# Altium footprint library CONN_HDR_2.54MM_RA.PcbLib: 62 footprints (part 1 of 5)
Each footprint in its own frame and in the unit in brackets; x right, y up, seen from the top. Pads: shape width x height; smd on the part's side, far side on the other; paste and mask are expansions set on the pad; w line width, h text height; cw(c..) or ccw(c..) is an arc to the next point about the centre after c.
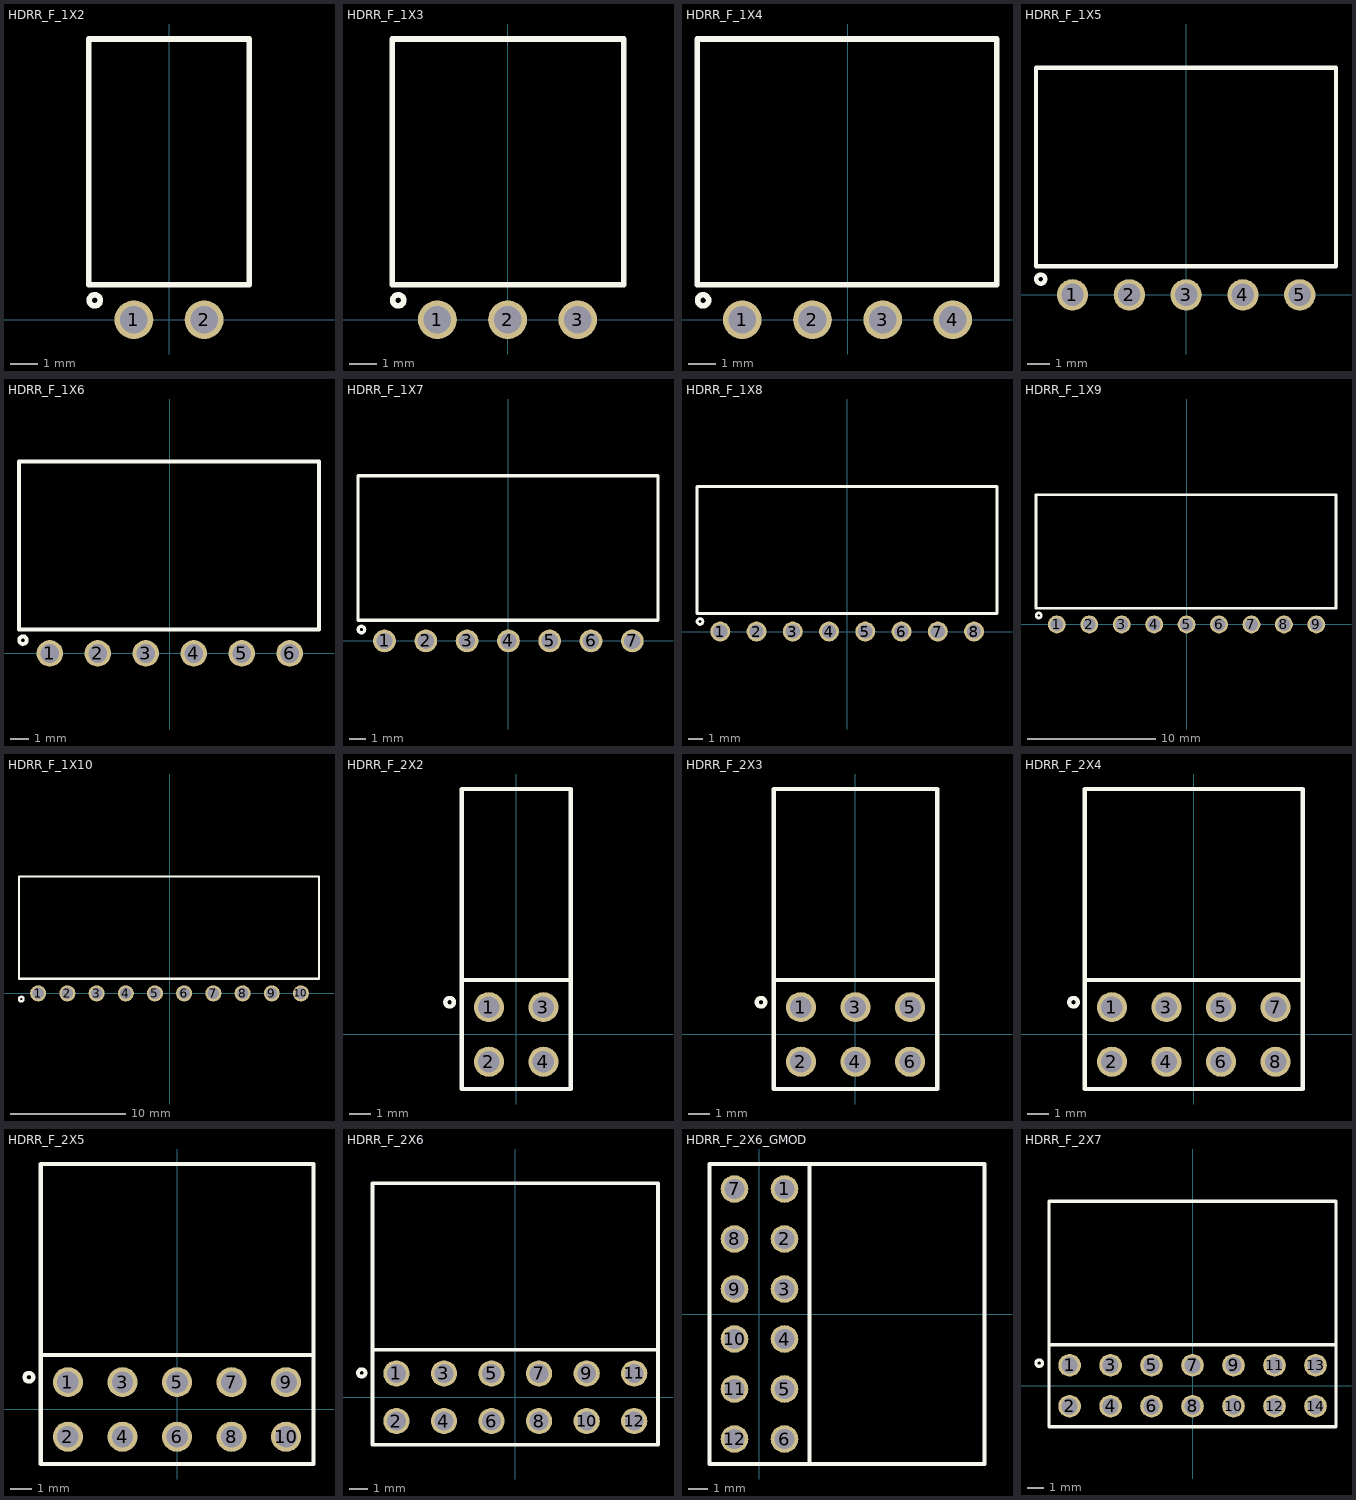
[diagram p0: the footprints below, top view; thin cyan lines are the x and y axes]

## HDRR_F_1X2 [mm] "Connector; Header; 2 Position; Right Angle"
height 12
pads (2):
  round 1.4 / inner round 1.4 / far side oval 1.4x2.2 hole 1: 1(-1.27,0) 2(1.27,0)
Top Overlay:
  circle w0.2: c-2.69,0.7 r0.2
  lines w0.2: -2.9,1.27 2.9,1.27 2.9,10.16 -2.9,10.16 -2.9,1.27
3D body "HDR_F_1X2RA.step": height 2.55, standoff -3.1, extent -2.786,-0.3 2.786,10

## HDRR_F_1X3 [mm] "Connector; Header; 3 Position; Right Angle"
height 12
pads (3):
  round 1.4 / inner round 1.4 / far side oval 1.4x2.2 hole 1: 1(-2.54,0) 2(0,0) 3(2.54,0)
Top Overlay:
  circle w0.2: c-3.96,0.7 r0.2
  lines w0.2: -4.17,1.27 4.2,1.27 4.2,10.16 -4.17,10.16 -4.17,1.27
3D body "HDR_F_1X3RA.step": height 2.55, standoff -3.1, extent -4.056,-0.3 4.039,10

## HDRR_F_1X4 [mm] "Connector; Header; 4 Position; Right Angle"
height 12
pads (4):
  round 1.4 / inner round 1.4 / far side oval 1.4x2.2 hole 1: 1(-3.81,0) 2(-1.27,0) 3(1.27,0) 4(3.81,0)
Top Overlay:
  circle w0.2: c-5.23,0.7 r0.2
  lines w0.2: -5.44,1.27 5.4,1.27 5.4,10.16 -5.44,10.16 -5.44,1.27
3D body "HDR_F_1X2RA.step": height 2.55, standoff -3.1, extent -0.246,-0.3 5.326,10
3D body "HDR_F_1X2RA.step": height 2.55, standoff -3.1, extent -5.326,-0.3 0.246,10

## HDRR_F_1X5 [mm] "Connector; Header; 5 Position"
pads (5):
  round 1.4 / inner round 1.4 / far side oval 1.4x2.2 hole 1 mask+0.1: 1(-5.08,0) 2(-2.54,0) 3(0,0) 4(2.54,0) 5(5.08,0)
Top Overlay:
  circle w0.2: c-6.5,0.7 r0.2
  lines w0.2: -6.71,1.27 6.7,1.27 6.7,10.16 -6.71,10.16 -6.71,1.27
3D body "HDR_F_1X2RA.step": height 2.55, standoff -3.1, extent -6.596,-0.3 -1.024,10
3D body "HDR_F_1X3RA.step": height 2.55, standoff -3.1, extent -1.516,-0.3 6.579,10

## HDRR_F_1X6 [mm] "Connector; Header; 6 Position"
pads (6):
  round 1.4 / inner round 1.4 / far side oval 1.4x2.2 hole 1 mask+0.1: 1(-6.35,0) 2(-3.81,0) 3(-1.27,0) 4(1.27,0) 5(3.81,0) 6(6.35,0)
Top Overlay:
  circle w0.2: c-7.77,0.7 r0.2
  lines w0.2: -7.98,1.27 7.9,1.27 7.9,10.16 -7.98,10.16 -7.98,1.27
3D body "HDR_F_1X3RA.step": height 2.55, standoff -3.1, extent -0.246,-0.3 7.849,10
3D body "HDR_F_1X3RA.step": height 2.55, standoff -3.1, extent -7.866,-0.3 0.229,10

## HDRR_F_1X7 [mm] "Connector; Header; 7 Position"
pads (7):
  round 1.4 / inner round 1.4 / far side oval 1.4x2.2 hole 1 mask+0.1: 1(-7.62,0) 2(-5.08,0) 3(-2.54,0) 4(0,0) 5(2.54,0) 6(5.08,0) 7(7.62,0)
Top Overlay:
  circle w0.2: c-9.04,0.7 r0.2
  lines w0.2: -9.25,1.27 -9.25,10.16 9.2,10.16 9.2,1.27 -9.25,1.27
3D body "HDR_F_1X3RA.step": height 2.55, standoff -3.1, extent 1.024,-0.3 9.119,10
3D body "HDR_F_1X2RA.step": height 2.55, standoff -3.1, extent -9.136,-0.3 -3.564,10
3D body "HDR_F_1X2RA.step": height 2.55, standoff -3.1, extent -4.056,-0.3 1.516,10

## HDRR_F_1X8 [mm] "Connector; Header; 8 Position"
pads (8):
  round 1.4 / inner round 1.4 / far side oval 1.4x2.2 hole 1 mask+0.1: 1(-8.89,0) 2(-6.35,0) 3(-3.81,0) 4(-1.27,0) 5(1.27,0) 6(3.81,0) 7(6.35,0) 8(8.89,0)
Top Overlay:
  circle w0.2: c-10.31,0.7 r0.2
  lines w0.2: -10.52,1.27 -10.52,10.16 10.5,10.16 10.5,1.27 -10.52,1.27
3D body "HDR_F_1X3RA.step": height 2.55, standoff -3.1, extent 2.294,-0.3 10.389,10
3D body "HDR_F_1X3RA.step": height 2.55, standoff -3.1, extent -5.326,-0.3 2.769,10
3D body "HDR_F_1X2RA.step": height 2.55, standoff -3.1, extent -10.406,-0.3 -4.834,10

## HDRR_F_1X9 [mm] "Connector; Header; 9 Position"
pads (9):
  round 1.4 / inner round 1.4 / far side oval 1.4x2.2 hole 1 mask+0.1: 1(-10.16,0) 2(-7.62,0) 3(-5.08,0) 4(-2.54,0) 5(0,0) 6(2.54,0) 7(5.08,0) 8(7.62,0) 9(10.16,0)
Top Overlay:
  circle w0.2: c-11.58,0.7 r0.2
  lines w0.2: -11.79,1.27 11.7,1.27 11.7,10.16 -11.79,10.16 -11.79,1.27
3D body "HDR_F_1X3RA.step": height 2.55, standoff -3.1, extent 3.564,-0.3 11.659,10
3D body "HDR_F_1X3RA.step": height 2.55, standoff -3.1, extent -4.056,-0.3 4.039,10
3D body "HDR_F_1X3RA.step": height 2.55, standoff -3.1, extent -11.676,-0.3 -3.581,10

## HDRR_F_1X10 [mm] "Connector; Header; 10 Position"
pads (10):
  round 1.4 / inner round 1.4 / far side oval 1.4x2.2 hole 1 mask+0.1: 1(-11.43,0) 2(-8.89,0) 3(-6.35,0) 4(-3.81,0) 5(-1.27,0) 6(1.27,0) 7(3.81,0) 8(6.35,0) 9(8.89,0) 10(11.43,0)
Top Overlay:
  circle w0.2: c-12.9,-0.5 r0.2
  lines w0.2: -13.1,1.27 13,1.27 13,10.16 -13.1,10.16 -13.1,1.27
3D body "BB02-JB102-XR2-000000-6T_rev1.9.STEP": height 2.55, standoff -3.1, extent -12.954,-0.3 12.946,10

## HDRR_F_2X2 [mm] "Connector; Header; 2x2 Position"
height 5
pads (4):
  round 1.4 / inner round 1.4 / far side oval 1.4x2.2 hole 1: 1(-1.27,1.27) 2(-1.27,-1.27) 3(1.27,1.27) 4(1.27,-1.27)
Top Overlay:
  circle w0.2: c-3.1,1.5 r0.2
  lines w0.2: -2.54,2.54 -2.54,11.43 2.54,11.43 2.54,2.54 ; -2.54,2.54 2.54,2.54 ; -2.54,2.54 -2.54,-2.54 2.54,-2.54 2.54,2.54
3D body "PBD-4R.step": height 5, standoff -3, extent -2.54,-1.57 2.54,11.43

## HDRR_F_2X3 [mm] "Connector; Header; 3x2 Position"
height 5
pads (6):
  round 1.4 / inner round 1.4 / far side oval 1.4x2.2 hole 1: 1(-2.54,1.27) 2(-2.54,-1.27) 3(0,1.27) 4(0,-1.27) 5(2.54,1.27) 6(2.54,-1.27)
Top Overlay:
  circle w0.2: c-4.4,1.5 r0.2
  lines w0.2: -3.81,2.54 3.81,2.54 ; -3.81,2.54 -3.81,-2.54 3.81,-2.54 3.81,2.54 ; -3.81,2.54 -3.81,11.43 3.81,11.43 3.81,2.54
3D body "PBD-6R.step": height 5, standoff -3, extent -3.81,-1.57 3.81,11.43

## HDRR_F_2X4 [mm] "Connector; Header; 4x2 Position"
height 5
pads (8):
  round 1.4 / inner round 1.4 / far side oval 1.4x2.2 hole 1: 1(-3.81,1.27) 2(-3.81,-1.27) 3(-1.27,1.27) 4(-1.27,-1.27) 5(1.27,1.27) 6(1.27,-1.27) 7(3.81,1.27) 8(3.81,-1.27)
Top Overlay:
  circle w0.2: c-5.6,1.5 r0.2
  lines w0.2: -5.08,2.54 -5.08,11.43 5.08,11.43 5.08,2.54 ; -5.08,2.54 -5.08,-2.54 5.08,-2.54 5.08,2.54 ; -5.08,2.54 5.08,2.54
3D body "PBD-8R.step": height 5, standoff -3, extent -5.08,-1.57 5.08,11.43

## HDRR_F_2X5 [mm] "Connector; Header; 5x2 Position"
height 5
pads (10):
  round 1.4 / inner round 1.4 / far side oval 1.4x2.2 hole 1: 1(-5.08,1.27) 2(-5.08,-1.27) 3(-2.54,1.27) 4(-2.54,-1.27) 5(0,1.27) 6(0,-1.27) 7(2.54,1.27) 8(2.54,-1.27) 9(5.08,1.27) 10(5.08,-1.27)
Top Overlay:
  circle w0.2: c-6.9,1.5 r0.2
  lines w0.2: -6.35,2.54 -6.35,-2.54 6.35,-2.54 6.35,2.54 ; -6.35,2.54 6.35,2.54 ; -6.35,2.54 -6.35,11.43 6.35,11.43 6.35,2.54
3D body "PBD-10R.step": height 5, standoff -3, extent -6.35,-1.57 6.35,11.43

## HDRR_F_2X6 [mm] "Connector; Header; 6x2 Position"
height 5
pads (12):
  round 1.4 / inner round 1.4 / far side oval 1.4x2.2 hole 1: 1(-6.35,1.27) 2(-6.35,-1.27) 3(-3.81,1.27) 4(-3.81,-1.27) 5(-1.27,1.27) 6(-1.27,-1.27) 7(1.27,1.27) 8(1.27,-1.27) 9(3.81,1.27) 10(3.81,-1.27) 11(6.35,1.27) 12(6.35,-1.27)
Top Overlay:
  circle w0.2: c-8.2,1.3 r0.2
  lines w0.2: -7.62,2.54 -7.62,-2.54 7.62,-2.54 7.62,2.54 ; -7.62,2.54 7.62,2.54 ; -7.62,2.54 -7.62,11.43 7.62,11.43 7.62,2.54
3D body "PBD-12R.step": height 5, standoff -3, extent -7.62,-1.57 7.62,11.43

## HDRR_F_2X6_GMOD [mm] "Connector; Header; 6x2 Position"
height 5
pads (12):
  round 1.4 / inner round 1.4 / far side oval 2.2x1.4 hole 1: 1(1.27,6.35) 2(1.27,3.81) 3(1.27,1.27) 4(1.27,-1.27) 5(1.27,-3.81) 6(1.27,-6.35) 7(-1.27,6.35) 8(-1.27,3.81) 9(-1.27,1.27) 10(-1.27,-1.27) 11(-1.27,-3.81) 12(-1.27,-6.35)
Top Overlay:
  lines w0.2: 2.54,-7.62 -2.54,-7.62 -2.54,7.62 2.54,7.62 ; 2.54,-7.62 11.43,-7.62 11.43,7.62 2.54,7.62 ; 2.54,-7.62 2.54,7.62
3D body "PBD-12R.step": height 5, standoff -3, extent -1.57,-7.62 11.43,7.62

## HDRR_F_2X7 [mm] "Connector; Header; 7x2 Position"
height 5
pads (14):
  round 1.4 / inner round 1.4 / far side oval 1.4x2.2 hole 1: 1(-7.62,1.27) 2(-7.62,-1.27) 3(-5.08,1.27) 4(-5.08,-1.27) 5(-2.54,1.27) 6(-2.54,-1.27) 7(0,1.27) 8(0,-1.27) 9(2.54,1.27) 10(2.54,-1.27) 11(5.08,1.27) 12(5.08,-1.27) 13(7.62,1.27) 14(7.62,-1.27)
Top Overlay:
  circle w0.2: c-9.5,1.4 r0.2
  lines w0.2: -8.89,2.54 -8.89,11.43 8.89,11.43 8.89,2.54 ; -8.89,2.54 8.89,2.54 ; -8.89,2.54 -8.89,-2.54 8.89,-2.54 8.89,2.54
3D body "PBD-14R.step": height 5, standoff -3, extent -8.89,-1.57 8.89,11.43